# Altium footprint library komponenty_ITS_v1.PcbLib: 81 footprints (part 1 of 6)
Each footprint in its own frame and in the unit in brackets; x right, y up, seen from the top. Pads: shape width x height; smd on the part's side, far side on the other; paste and mask are expansions set on the pad; w line width, h text height; cw(c..) or ccw(c..) is an arc to the next point about the centre after c.
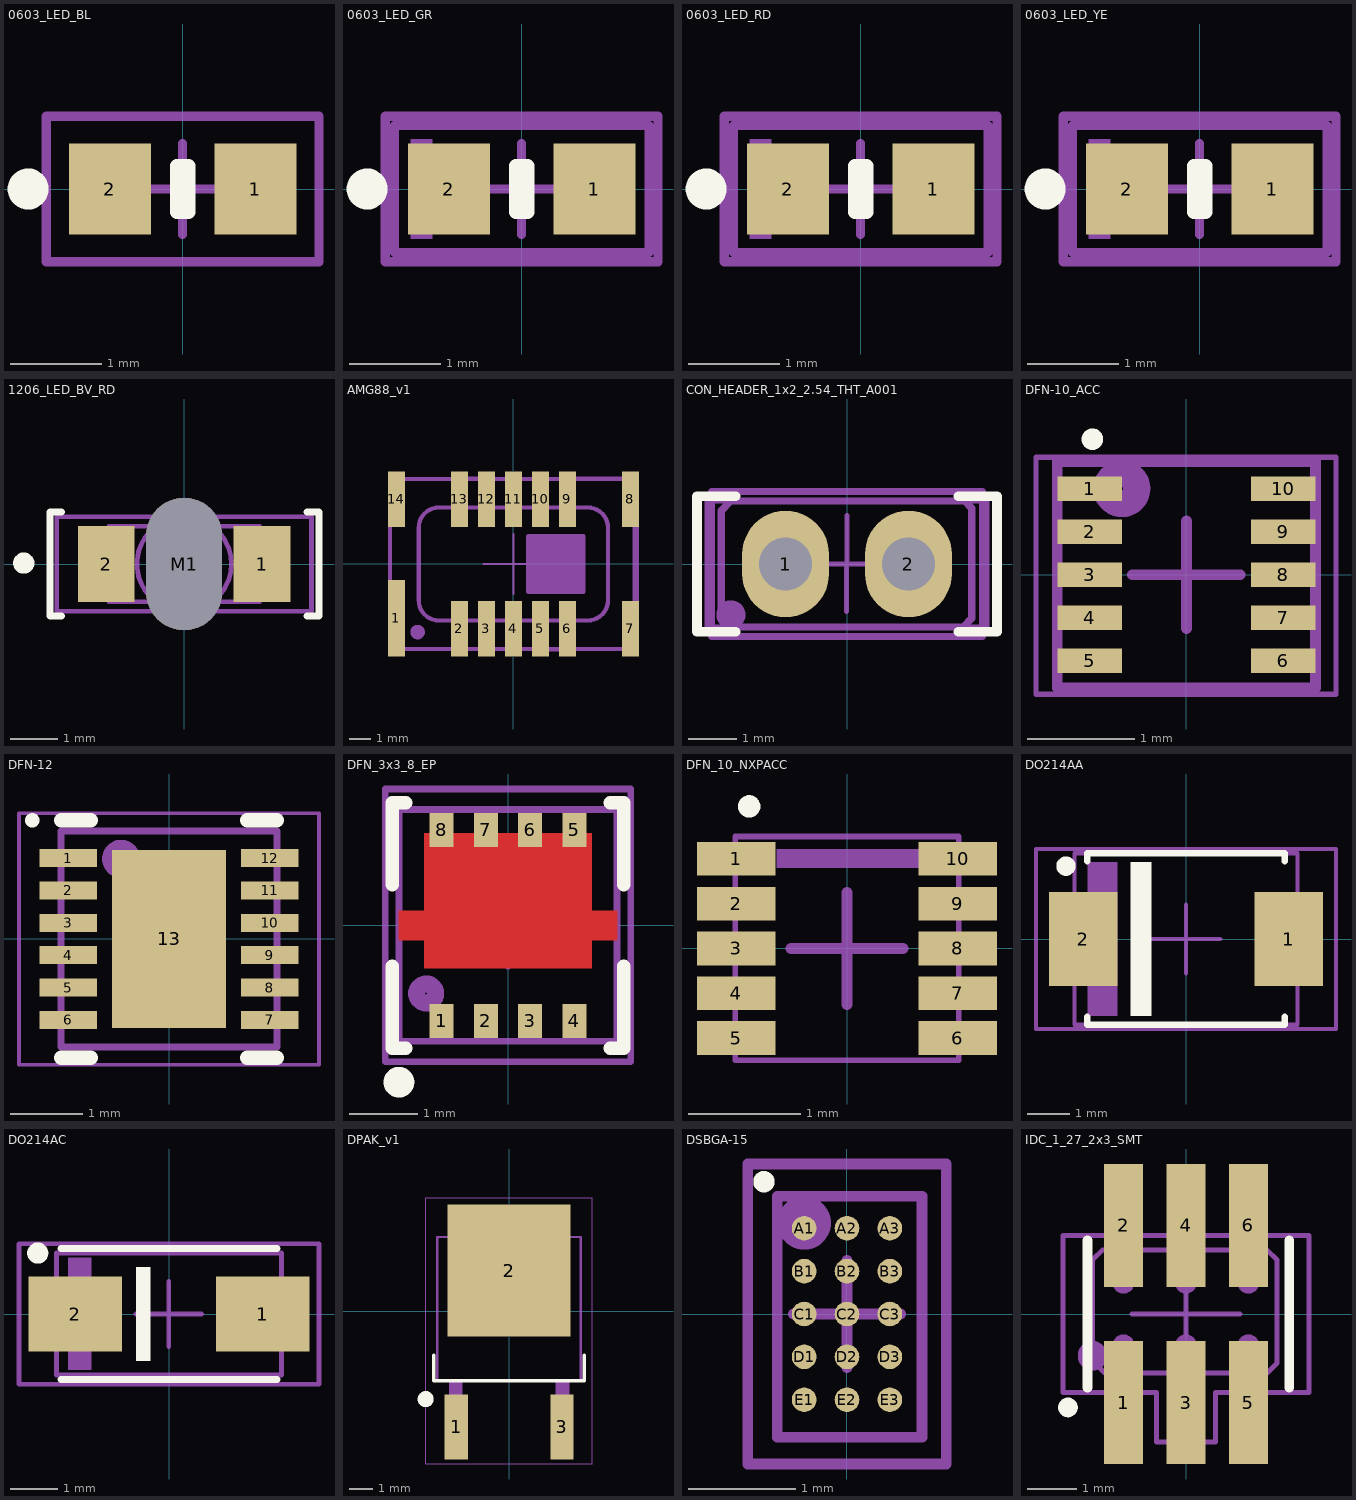
[diagram p0: the footprints below, top view; thin cyan lines are the x and y axes]

## 0603_LED_BL [mm] "0603 LED Blue"
height 0.381
pads (2):
  rect 0.9x1 smd: 1(0.8,0) 2(-0.8,0)
Top Overlay:
  circle w0.25: c-1.7,0 r0.1
  lines w0.152: -0.064,-0.254 0.064,-0.254 0.064,0.254 -0.064,0.254 -0.064,-0.254
Top M11-12_SMOT:
  lines w0.1: -1.5,-0.8 -1.5,0.8 1.5,0.8 1.5,-0.8 -1.5,-0.8
Top M13-14_SDES:
  text "'.Designator'" at -2.832,-0.208 h0.5
M15_orgin:
  lines w0.1: -0.5,0 0.5,0 ; 0,-0.5 0,0.5 ; -1.5,-0.8 -1.5,0.8 1.5,0.8 1.5,-0.8 -1.5,-0.8

## 0603_LED_GR [mm] "0603 LED Green"
height 0.381
pads (2):
  rect 0.9x1 smd: 1(0.8,0) 2(-0.8,0)
Top Overlay:
  circle w0.25: c-1.7,0 r0.1
  lines w0.152: -0.064,-0.254 0.064,-0.254 0.064,0.254 -0.064,0.254 -0.064,-0.254
Top M11-12_SMOT:
  rectangle: -1.22,-0.55 -0.983,0.549
  lines w0.1: -1.4,-0.7 1.4,-0.7 1.4,0.7 -1.4,0.7 -1.4,-0.7
Top M13-14_SDES:
  text "'.Designator'" at -2.832,-0.208 h0.5
M15_orgin:
  lines w0.1: -0.5,0 0.5,0 ; 0,-0.5 0,0.5 ; -1.5,-0.8 1.5,-0.8 1.5,0.8 -1.5,0.8 -1.5,-0.8
3D body "LED_0603_G.STEP": height 0.61, standoff 0.01, extent -0.8,-0.4 0.8,0.4

## 0603_LED_RD [mm] "0603 LED Red"
height 0.381
pads (2):
  rect 0.9x1 smd: 1(0.8,0) 2(-0.8,0)
Top Overlay:
  circle w0.25: c-1.7,0 r0.1
  lines w0.152: -0.064,-0.254 0.064,-0.254 0.064,0.254 -0.064,0.254 -0.064,-0.254
Top M11-12_SMOT:
  rectangle: -1.22,-0.55 -0.983,0.549
  lines w0.1: -1.4,-0.7 -1.4,0.7 1.4,0.7 1.4,-0.7 -1.4,-0.7
Top M13-14_SDES:
  text "'.Designator'" at -2.832,-0.208 h0.5
M15_orgin:
  lines w0.1: -0.5,0 0.5,0 ; 0,-0.5 0,0.5 ; -1.5,-0.8 -1.5,0.8 1.5,0.8 1.5,-0.8 -1.5,-0.8
3D body "led_0603_red.STEP": height 0.71, standoff 0.01, extent -0.8,-0.4 0.8,0.4

## 0603_LED_YE [mm] "0603 LED Yellow"
height 0.381
pads (2):
  rect 0.9x1 smd: 1(0.8,0) 2(-0.8,0)
Top Overlay:
  circle w0.25: c-1.7,0 r0.1
  lines w0.152: -0.064,-0.254 0.064,-0.254 0.064,0.254 -0.064,0.254 -0.064,-0.254
Top M11-12_SMOT:
  rectangle: -1.22,-0.55 -0.983,0.549
  lines w0.1: -1.4,-0.7 -1.4,0.7 1.4,0.7 1.4,-0.7 -1.4,-0.7
Top M13-14_SDES:
  text "'.Designator'" at -2.832,-0.208 h0.5
M15_orgin:
  lines w0.1: -0.5,0 0.5,0 ; 0,-0.5 0,0.5 ; -1.5,-0.8 -1.5,0.8 1.5,0.8 1.5,-0.8 -1.5,-0.8
3D body "LED_0603_Y.STEP": height 0.61, standoff 0.01, extent -0.8,-0.4 0.8,0.4

## 1206_LED_BV_RD [mm] "1206 LED Red bottom viev"
height 0.381
pads (3):
  rect 1.2x1.6 smd: 1(1.65,0) 2(-1.65,0)
  oval 1.6x2.8 hole 1.6 slot 2.8 at 90 deg unplated mask+0: M1(0,0)
Top Overlay:
  circle w0.25: c-3.399,0.019 r0.1
  lines w0.152: -2.6,-1.1 -2.845,-1.1 -2.845,1.1 -2.6,1.1 ; 2.6,-1.1 2.857,-1.1 2.857,1.1 2.6,1.1
Top M11-12_SMOT:
  rectangle: -1.337,-0.6 -1.1,0.579
  rectangle: -2.1,-0.8 -1.6,0.8
  region: 2.1,0.8 1.6,0.8 1.6,-0.8 2.1,-0.8
  lines w0.1: -1.6,-0.8 -1.6,0.8 1.6,0.8 1.6,-0.8 -1.6,-0.8
Top M13-14_SDES:
  text "'.Designator'" at -2.832,1.792 h0.5
M15_orgin:
  circle w0.1: c0,0 r1
  lines w0.1: -0.5,0 0.5,0 ; 0,-0.5 0,0.5 ; -2.7,-1 -2.7,1 2.7,1 2.7,-1 -2.7,-1
3D body "156125RS57000_LED_RD_BV_1205.stp": height 0.29, standoff -0.81, extent -1.6,-0.6 1.6,0.6

## AMG88_v1 [mm]
pads (14):
  rect 0.8x3.6 smd: 1(-5.5,-2.55)
  rect 0.8x2.6 smd: 2(-2.54,-3.05) 3(-1.27,-3.05) 4(0,-3.05) 5(1.27,-3.05) 6(2.54,-3.05) 7(5.5,-3.05) 8(5.5,3.05) 9(2.54,3.05) 10(1.27,3.05) 11(0,3.05) 12(-1.27,3.05) 13(-2.54,3.05) 14(-5.5,3.05)
Top M11-12_SMOT:
  drawing of 53 lines, arcs and shapes, not listed
Top M13-14_SDES:
  text "'.Designator'" at -7.815,-0.367 h1
M15_orgin:
  lines w0.1: -1.4,0 0,0 ; 0,-1.4 0,0 ; 0,1.4 0,0 ; 2,-1.3 2,1.3 ; 3.3,0 1.4,0 0,0
  lines w0.2: -5.8,-4 5.8,-4 5.8,4 -5.8,4 -5.8,-4 ; 0.7,-1.3 3.3,-1.3 3.3,1.3 0.7,1.3 0.7,-1.3
3D body "AMG88-1.STEP": height 4.31, standoff 0.01, extent -5.8,-4 5.8,4

## CON_HEADER_1x2_2.54_THT_A001 [mm]
pads (2):
  oval 1.8x2.2 hole 1.1 unplated paste-1: 1(-1.27,0) 2(1.27,0)
Top Overlay:
  lines w0.2: -2.3,-1.4 -3.1,-1.4 -3.1,1.4 -2.3,1.4 ; 2.3,-1.4 3.1,-1.4 3.1,1.4 2.3,1.4
M15_orgin:
  lines w0.1: -1,0 0,0 0,1 ; -0.01,-0.986 -0.01,0.014 ; -0.01,0 0.99,0 ; -2.9,-1.3 -2.9,1.3 2.9,1.3 2.9,-1.3 -2.9,-1.3
Top M17-18_TDES:
  text "'.Designator'" at -5.665,2.083 h1
Top M19-20_TMOT:
  circle w0.3: c-2.4,-1.05 r0.15
  lines w0.15: -2.8,-1.5 -2.8,1.5 2.8,1.5 2.8,-1.5 -2.8,-1.5 ; -2.6,-1.078 -2.378,-1.3 2.4,-1.3 2.579,-1.121 2.579,1.154 2.433,1.3 -2.4,1.3 -2.6,1.1 -2.6,-1.078
3D body "61300211821_CON_1x2_2_54mm.stp": height 8.51, standoff -3.1, extent -2.79,-1.25 2.79,1.25

## DFN-10_ACC [mm] "PQFN, 10-Leads, Body 2,00x2,00mm, Pitch 0,40mm, Thermal Pad 0,50x0,50mm, IPC Medium Density"
height 1
pads (10):
  rect 0.6x0.225 smd: 1(-0.9,0.8) 2(-0.9,0.4) 3(-0.9,0) 4(-0.9,-0.4) 5(-0.9,-0.8) 6(0.9,-0.8) 7(0.9,-0.4) 8(0.9,0) 9(0.9,0.4) 10(0.9,0.8)
Top Overlay:
  circle w0.1: c-0.873,1.26 r0.05
Top M11-12_SMOT:
  circle w0.25: c-0.6,0.8 r0.14
  region: 1.2,0.714 1.2,0.885 0.756,0.885 0.756,0.714
  region: 1.2,0.314 1.2,0.485 0.756,0.485 0.756,0.314
  region: 1.2,-0.086 1.2,0.085 0.756,0.085 0.756,-0.086
  region: 1.2,-0.486 1.2,-0.315 0.756,-0.315 0.756,-0.486
  region: 1.2,-0.886 1.2,-0.715 0.756,-0.715 0.756,-0.886
  region: -1.2,-0.714 -1.2,-0.885 -0.756,-0.885 -0.756,-0.714
  region: -1.2,-0.314 -1.2,-0.485 -0.756,-0.485 -0.756,-0.314
  region: -1.2,0.086 -1.2,-0.085 -0.756,-0.085 -0.756,0.086
  region: -1.2,0.486 -1.2,0.315 -0.756,0.315 -0.756,0.486
  region: -1.2,0.886 -1.2,0.715 -0.95,0.715 -0.95,0.886
  lines w0.1: -1.2,-1.05 -1.2,1.05 1.2,1.05 1.2,-1.05 -1.2,-1.05
Top M13-14_SDES:
  text "'.Designator'" at -3.915,-0.292 h0.7
M15_orgin:
  lines w0.05: -1.398,-1.111 1.391,-1.111 1.391,1.09 -1.398,1.09 -1.398,-1.111
  lines w0.1: -0.5,0 0.5,0 ; 0,-0.5 0,0.5
3D body "DFN-10_ACC.step": height 1, standoff 0, extent -1,-1 1,1

## DFN-12 [mm] "FTDI DFN-12"
height 0.9
pads (13):
  rect 0.8x0.25 smd: 1(-1.4,1.125) 2(-1.4,0.675) 3(-1.4,0.225) 4(-1.4,-0.225) 5(-1.4,-0.675) 6(-1.4,-1.125) 7(1.4,-1.125) 8(1.4,-0.675) 9(1.4,-0.225) 10(1.4,0.225) 11(1.4,0.675) 12(1.4,1.125)
  rect 1.58x2.48 smd: 13(0,0)
Top Overlay:
  circle w0.1: c-1.9,1.65 r0.05
  lines w0.2: -1.5,-1.65 -1.09,-1.65 ; -1.5,1.65 -1.09,1.65 ; 1.09,-1.65 1.5,-1.65 ; 1.09,1.65 1.5,1.65
Top M11-12_SMOT:
  circle w0.25: c-0.665,1.114 r0.14
  region: 1.545,1.014 1.545,1.234 1.035,1.234 1.035,1.014
  region: 1.545,0.564 1.545,0.784 1.035,0.784 1.035,0.564
  region: 1.545,0.114 1.545,0.334 1.035,0.334 1.035,0.114
  region: 1.545,-0.336 1.545,-0.116 1.035,-0.116 1.035,-0.336
  region: 1.545,-0.786 1.545,-0.566 1.035,-0.566 1.035,-0.786
  region: 1.545,-1.236 1.545,-1.016 1.035,-1.016 1.035,-1.236
  region: -1.545,0.336 -1.545,0.116 -1.035,0.116 -1.035,0.336
  region: -1.545,0.786 -1.545,0.566 -1.035,0.566 -1.035,0.786
  region: -1.545,1.236 -1.545,1.016 -1.035,1.016 -1.035,1.236
  region: -1.545,-1.014 -1.545,-1.234 -1.035,-1.234 -1.035,-1.014
  region: -1.545,-0.564 -1.545,-0.784 -1.035,-0.784 -1.035,-0.564
  region: -1.545,-0.114 -1.545,-0.334 -1.035,-0.334 -1.035,-0.114
  lines w0.1: -1.5,-1.5 1.5,-1.5 1.5,1.5 -1.5,1.5 -1.5,-1.5
Top M13-14_SDES:
  text "'.Designator'" at 0.333,-4.532 h0.8
M15_orgin:
  lines w0.05: -2.085,-1.75 -2.085,1.75 2.085,1.75 2.085,-1.75 -2.085,-1.75
  lines w0.1: -0.5,0 0.5,0 ; 0,-0.5 0,0.5
3D body "DFN-12.step": height 0.9, standoff 0, extent -1.501,-1.5 1.501,1.5

## DFN_3x3_8_EP [mm]
pads (8):
  rect 0.35x0.5 smd mask+0.1: 1(-0.975,-1.4) 2(-0.325,-1.4) 3(0.325,-1.4) 4(0.975,-1.4) 5(0.975,1.4) 6(0.325,1.4) 7(-0.325,1.4) 8(-0.975,1.4)
Top Layer:
  region: -1.6,-0.215 -1.6,0.215 -1.225,0.215 -1.225,1.35 1.225,1.35 1.225,0.215 1.6,0.215 1.6,-0.215 1.225,-0.215 1.225,-0.63 -1.225,-0.63 -1.225,-0.215
Top Overlay:
  circle w0.25: c-1.6,-2.3 r0.1
  lines w0.2: -1.7,-0.6 -1.7,-1.8 -1.5,-1.8 ; -1.7,0.6 -1.7,1.8 -1.5,1.8 ; 1.5,-1.8 1.7,-1.8 1.7,-0.6 ; 1.5,1.8 1.7,1.8 1.7,0.6
Top M11-12_SMOT:
  circle w0.25: c-1.2,-1 r0.14
  region: 1.123,1.7 0.821,1.7 0.821,1.2 1.123,1.2
  region: 0.473,1.7 0.171,1.7 0.171,1.2 0.473,1.2
  rectangle: 0.827,-1.7 1.129,-1.2
  rectangle: 0.177,-1.7 0.479,-1.2
  region: -0.177,1.7 -0.479,1.7 -0.479,1.2 -0.177,1.2
  region: -0.827,1.7 -1.129,1.7 -1.129,1.2 -0.827,1.2
  rectangle: -0.473,-1.7 -0.171,-1.2
  rectangle: -1.123,-1.7 -0.821,-1.3
  lines w0.1: -1.6,-1.7 1.6,-1.7 1.6,1.7 -1.6,1.7 -1.6,-1.7
Top M13-14_SDES:
  text "'.Designator'" at -4.532,-0.333 h0.8
M15_orgin:
  lines w0.1: -0.6,0 0,0 ; 0,-0.6 0,0 ; 0,0.6 0,0 ; 0.6,0 0,0 ; -1.8,-2 1.8,-2 1.8,2 -1.8,2 -1.8,-2
3D body "DFN_3x3_8L_EP2_P.STEP": height 0.82, standoff 0.01, extent -1.55,-1.6 1.55,1.6

## DFN_10_NXPACC [mm] "FXLS8964"
height 1
pads (10):
  rect 0.7x0.3 smd: 1(-0.99,0.8) 2(-0.99,0.4) 3(-0.99,0) 4(-0.99,-0.4) 5(-0.99,-0.8) 6(0.99,-0.8) 7(0.99,-0.4) 8(0.99,0) 9(0.99,0.4) 10(0.99,0.8)
Top Overlay:
  circle w0.1: c-0.874,1.269 r0.05
Top M11-12_SMOT:
  rectangle: -1.041,-0.531 -0.831,-0.278
  rectangle: -1.041,-0.931 -0.831,-0.678
  rectangle: -1.041,0.669 -0.831,0.922
  rectangle: -1.041,0.269 -0.831,0.522
  region: 1.041,-0.669 0.831,-0.669 0.831,-0.922 1.041,-0.922
  region: 1.041,-0.269 0.831,-0.269 0.831,-0.522 1.041,-0.522
  region: 1.041,0.531 0.831,0.531 0.831,0.278 1.041,0.278
  region: 1.041,0.931 0.831,0.931 0.831,0.678 1.041,0.678
  rectangle: -1.041,-0.131 -0.831,0.122
  region: 1.041,0.131 0.831,0.131 0.831,-0.122 1.041,-0.122
  rectangle: -0.628,0.719 0.653,0.887
  lines w0.05: -1,-0.999 -1,1 1,1 1,-0.999 -1,-0.999
Top M13-14_SDES:
  text "'.Designator'" at 0.25,-3.399 h0.6
M15_orgin:
  lines w0.1: -0.5,0 0.5,0 ; 0,-0.5 0,0.5
3D body "DFN_10_NXPACC.step": height 1, standoff 0, extent -1.001,-1 1.001,1

## DO214AA [mm]
pads (2):
  rect 1.6x2.2 smd: 1(2.4,0) 2(-2.4,0)
Top Overlay:
  circle w0.25: c-2.8,1.7 r0.1
  rectangle: -1.3,-1.8 -0.8,1.8
  lines w0.152: -2.3,-1.82 -2.3,-2 2.3,-2 2.3,-1.82 ; -2.3,1.82 -2.3,2 2.3,2 2.3,1.82
Top M11-12_SMOT:
  rectangle: -2.3,-1.8 -1.6,1.8
  region: 3.1,1.1 2.6,1.1 2.6,-1.064 3.1,-1.064
  rectangle: -3.1,-1.1 -2.6,1.064
  lines w0.1: -2.6,-2 2.6,-2 2.6,2 -2.6,2 -2.6,-2
Top M13-14_SDES:
  text "'.Designator'" at -5.665,-0.417 h1
M15_orgin:
  lines w0.1: -0.8,0 0,0 ; 0,-0.8 0,0 ; 0,0.8 0,0 ; 0.8,0 0,0 ; -3.5,-2.1 3.5,-2.1 3.5,2.1 -3.5,2.1 -3.5,-2.1
3D body "DO214AA.step": height 2.45, standoff 0.03, extent -2.754,-1.95 2.746,1.95

## DO214AC [mm]
pads (2):
  rect 2x1.6 smd: 1(2,0) 2(-2,0)
Top Overlay:
  circle w0.25: c-2.8,1.3 r0.1
  rectangle: -0.7,-1 -0.4,1
  lines w0.152: -2.3,-1.4 2.3,-1.4 ; -2.3,1.4 2.3,1.4
Top M11-12_SMOT:
  rectangle: -2.9,-0.7 -2.4,0.7
  region: 2.9,0.69 2.4,0.69 2.4,-0.697 2.9,-0.697
  rectangle: -2.157,-1.193 -1.657,1.207
  lines w0.1: -2.4,-1.3 -2.4,1.3 2.4,1.3 2.4,-1.3 -2.4,-1.3
Top M13-14_SDES:
  text "'.Designator'" at -4.232,-0.333 h0.8
M15_orgin:
  lines w0.1: -0.704,-0.001 -0.004,-0.001 ; -0.004,-0.702 -0.004,-0.001 ; -0.004,0.7 -0.004,-0.001 ; 0.697,-0.001 -0.004,-0.001 ; -3.2,-1.5 3.2,-1.5 3.2,1.5 -3.2,1.5 -3.2,-1.5
3D body "DO-214AC.step": height 2.45, standoff 0.05, extent -2.604,-1.301 2.596,1.299

## DPAK_v1 [mm] "D-PAK, 3-Pads, Body 6,20x6,72mm (max), IPC Low Density"
height 2.39
pads (3):
  rect 1x2.8 smd: 1(-2.28,-5) 3(2.28,-5)
  rect 5.3x5.7 smd: 2(0,1.75)
Top Overlay:
  circle w0.35: c-3.6,-3.8 r0.172
  lines w0.152: -3.25,-1.9 -3.25,-3 3.25,-3 3.25,-1.9
Top M11-12_SMOT:
  rectangle: -2.6,-5.8 -2,-3
  rectangle: 2,-5.8 2.6,-3
  region: 2.6,3.2 2.6,4.3 -2.6,4.3 -2.6,3.2
  lines w0.1: -3.1,-3 -3.1,3.2 3.1,3.2 3.1,-3 -3.1,-3
Top M13-14_SDES:
  text "'.Designator'" at -5.665,-2.417 h1
M15_orgin:
  lines w0.05: -3.6,-6.6 3.6,-6.6 3.6,4.9 -3.6,4.9 -3.6,-6.6
  lines w0.1: -0.5,0 0.5,0 ; 0,-0.5 0,0.5
3D body "DPAK-1.step": height 2.3, standoff -0.12, extent -3.27,-5.811 3.27,4.127

## DSBGA-15 [mm] "BGA, 15-Leads, Body 1,34x2,26mmx0,63mm, Pitch 0,40mm"
height 0.63
pads (15):
  round 0.23 smd mask+0.05: A1(-0.4,0.8) A2(0,0.8) A3(0.4,0.8) B1(-0.4,0.4) B2(0,0.4) B3(0.4,0.4) C1(-0.4,0) C2(0,0) C3(0.4,0) D1(-0.4,-0.4) D2(0,-0.4) D3(0.4,-0.4) E1(-0.4,-0.8) E2(0,-0.8) E3(0.4,-0.8)
Top Overlay:
  circle w0.1: c-0.775,1.235 r0.05
Top M11-12_SMOT:
  circle w0.4: c-0.4,0.85 r0.05
  lines w0.1: -0.65,-1.15 0.7,-1.15 0.7,1.1 -0.65,1.1 -0.65,-1.15
Top M13-14_SDES:
  text "'.Designator'" at -3.399,-0.25 h0.6
M15_orgin:
  lines w0.1: -0.5,0 0.5,0 ; 0,-0.5 0,0.5 ; -0.925,-1.4 0.925,-1.4 0.925,1.4 -0.925,1.4 -0.925,-1.4
3D body "DSBGA-15.step": height 0.63, standoff 0, extent -0.67,-1.13 0.67,1.13

## IDC_1_27_2x3_SMT [mm] "IDC 2x3 1,27 mm SMT OEM"
pads (6):
  rect 0.8x2.5 smd: 1(-1.27,-1.8) 2(-1.27,1.8) 3(0,-1.8) 4(0,1.8) 5(1.27,-1.8) 6(1.27,1.8)
Top Overlay:
  circle w0.2: c-2.4,-1.9 r0.1
  lines w0.2: -2,-1.5 -2,1.5 ; 2.1,-1.5 2.1,1.5
Top M11-12_SMOT:
  circle w0.2: c0,0.635 r0.12
  circle w0.2: c0,-0.635 r0.12
  circle w0.2: c1.27,0.635 r0.12
  circle w0.2: c-1.27,0.635 r0.12
  circle w0.2: c-1.27,-0.635 r0.12
  circle w0.2: c1.27,-0.635 r0.12
  circle w0.4: c-1.9,-0.85 r0.1
  rectangle: -1.488,0.656 -1.051,2.072
  rectangle: -0.218,0.656 0.219,2.072
  rectangle: 1.052,0.656 1.489,2.072
  region: 1.488,-0.656 1.051,-0.656 1.051,-2.072 1.488,-2.072
  region: 0.218,-0.656 -0.219,-0.656 -0.219,-2.072 0.218,-2.072
  region: -1.052,-0.656 -1.489,-0.656 -1.489,-2.072 -1.052,-2.072
  lines w0.1: -1.9,-0.95 -1.65,-1.2 1.65,-1.2 1.85,-1 1.85,1.1 1.65,1.3 -1.7,1.3 -1.9,1.1 -1.9,-0.95
Top M13-14_SDES:
  text "'.Designator'" at -5.665,-0.416 h1
M15_orgin:
  lines w0.1: -1.1,0 0,0 ; 0,-1.1 0,0 ; 0,1.1 0,0 ; 1.1,0 0,0 ; -2.5,-1.6 -0.6,-1.6 -0.6,-2.6 0.6,-2.6 0.6,-1.6 2.5,-1.6 2.5,1.6 -2.5,1.6 -2.5,-1.6
3D body "2x3_pin_SMT_127_62130621021_B.STEP": height 5.92, standoff 0.01, extent -1.905,-2.5 1.905,2.5